# Altium footprint library Supernova.PcbLib: 77 footprints (part 1 of 6)
Each footprint in its own frame and in the unit in brackets; x right, y up, seen from the top. Pads: shape width x height; smd on the part's side, far side on the other; paste and mask are expansions set on the pad; w line width, h text height; cw(c..) or ccw(c..) is an arc to the next point about the centre after c.
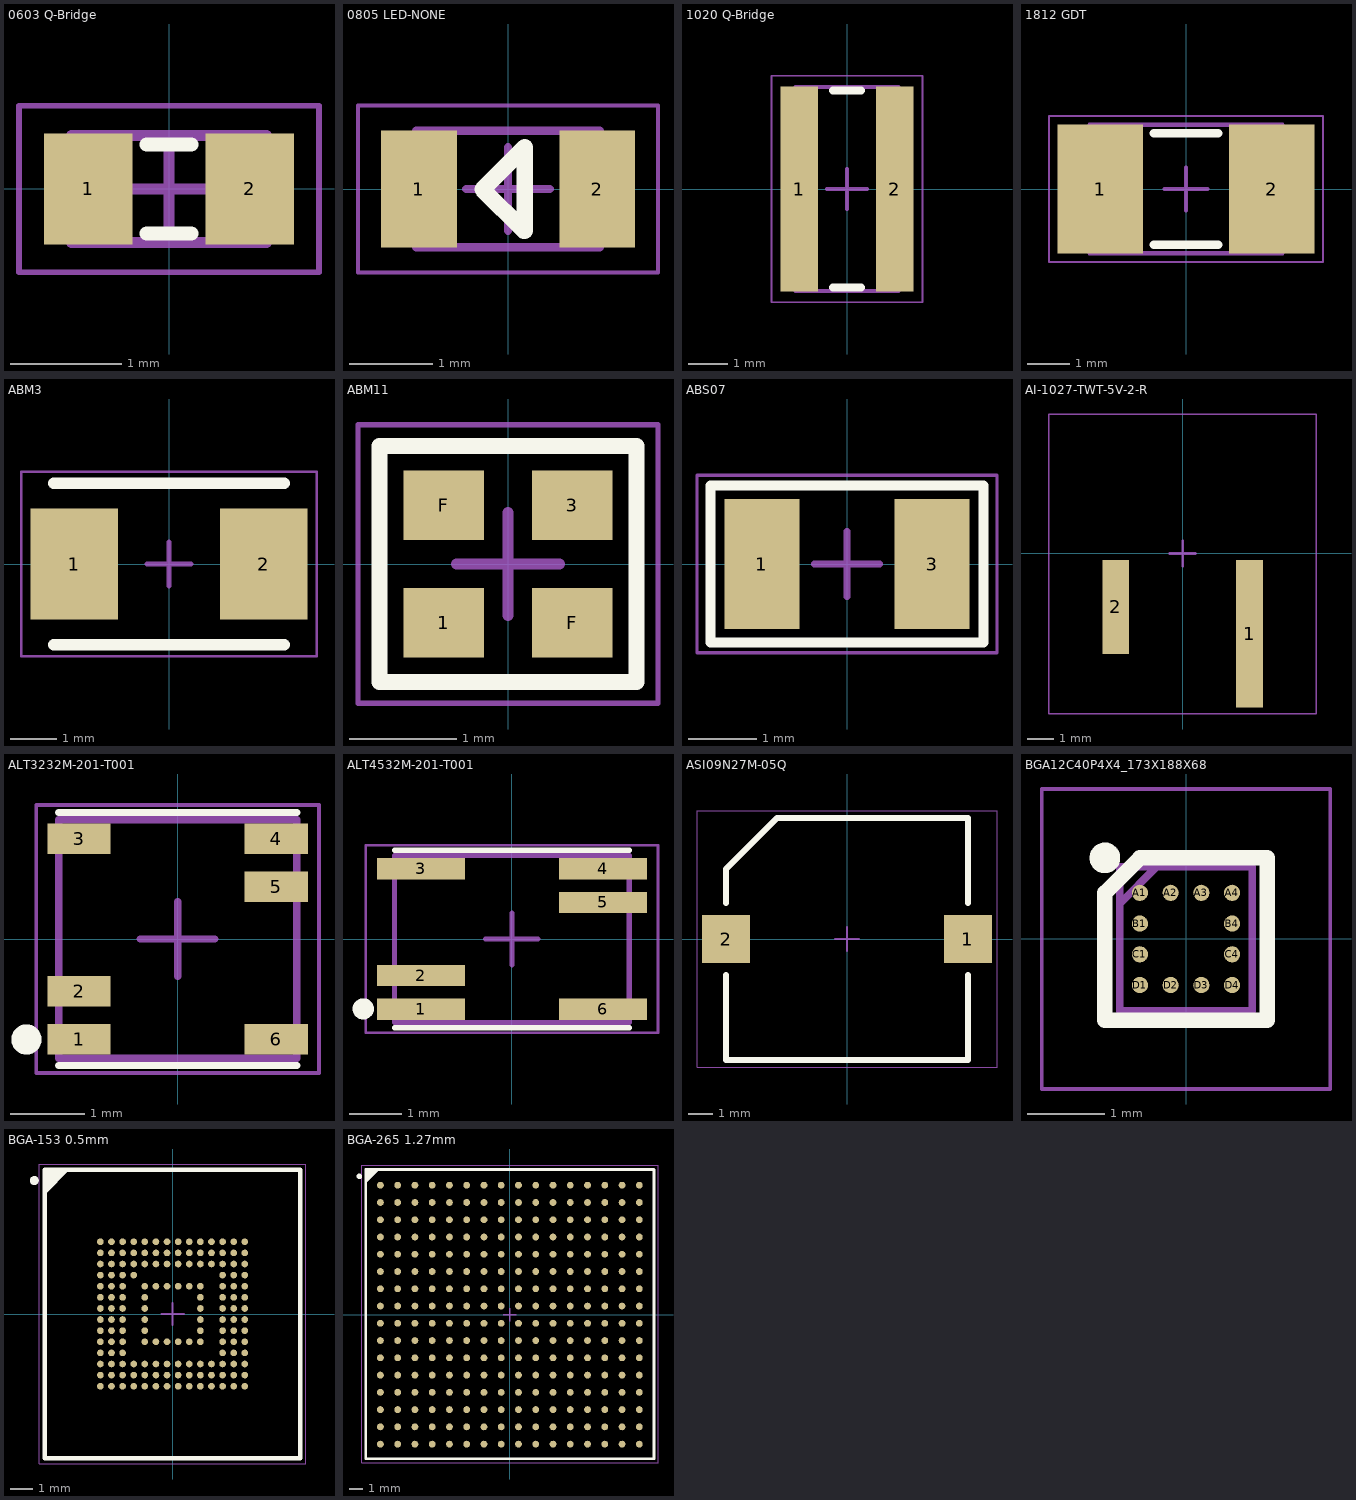
[diagram p0: the footprints below, top view; thin cyan lines are the x and y axes]

## 0603 Q-Bridge [mm] "Chip Capacitor, 2-Leads, Body 1.60x0.81mm, IPC Medium Density"
height 0.9
pads (2):
  rect 0.798x1 smd mask+0.051: 1(-0.726,0) 2(0.726,0)
Top Overlay:
  lines w0.127: -0.2,-0.4 0.2,-0.4 ; -0.2,0.4 0.2,0.4
Top 3D Body:
  lines w0.1: -0.875,-0.48 0.875,-0.48 0.875,0.48 -0.875,0.48 -0.875,-0.48
Top Courtyard:
  lines w0.05: -1.35,-0.75 1.35,-0.75 1.35,0.75 -1.35,0.75 -1.35,-0.75
  lines w0.1: -0.48,0 0.48,0 ; 0,-0.48 0,0.48
3D body: height 0.9, standoff 0, extent 0.525,-0.48 0.875,0.48
3D body: height 0.9, standoff 0, extent -0.875,-0.48 -0.525,0.48
3D body: height 0.9, standoff 0, extent -0.525,-0.48 0.525,0.48

## 0805 LED-NONE [mm] "Chip LED, 2-Leads, Body 2.05x1.25mm, IPC Medium Density"
height 0.8
pads (2):
  rect 0.91x1.41 smd: 1(-1.07,0) 2(1.07,0)
Top Overlay:
  lines w0.2: 0.192,-0.5 -0.304,-0.004 0.2,0.5 0.2,-0.5
Top 3D Body:
  lines w0.1: -1.1,-0.7 -1.1,0.7 1.1,0.7 1.1,-0.7 -1.1,-0.7
Top Courtyard:
  lines w0.05: -1.8,-1 -1.8,1 1.8,1 1.8,-1 -1.8,-1
  lines w0.1: -0.5,0 0.5,0 ; 0,-0.5 0,0.5
3D body: height 0.3, standoff 0, extent -0.75,-0.7 0.75,0.7
3D body: height 0.8, standoff 0.3, extent -0.75,-0.7 0.75,0.7
3D body: height 0.3, standoff 0, extent -1.1,-0.7 -0.75,0.7
3D body: height 0.3, standoff 0, extent 0.75,-0.7 1.1,0.7

## 1020 Q-Bridge [mm] "Chip Resistor, 2-Leads, Body 2.54x5.08mm, IPC Medium Density"
height 1.07
pads (2):
  rect 0.95x5.15 smd: 1(-1.2,0) 2(1.2,0)
Top Overlay:
  lines w0.2: -0.35,-2.475 0.35,-2.475 ; -0.35,2.475 0.35,2.475
Top 3D Body:
  lines w0.1: -1.295,-2.565 1.295,-2.565 1.295,2.565 -1.295,2.565 -1.295,-2.565
Top Courtyard:
  lines w0.05: -1.9,-2.85 1.9,-2.85 1.9,2.85 -1.9,2.85 -1.9,-2.85
  lines w0.1: -0.5,0 0.5,0 ; 0,-0.5 0,0.5
3D body: height 1.07, standoff 0, extent 0.785,-2.565 1.295,2.565
3D body: height 1.07, standoff 0, extent -1.295,-2.565 -0.785,2.565
3D body: height 1.07, standoff 0, extent -0.785,-2.565 0.785,2.565

## 1812 GDT [mm] "Chip Resistor, 2-Leads, Body 6.10x2.54mm, IPC Medium Density"
height 2.79
pads (2):
  rect 2x3 smd paste-0.25: 1(-2,0) 2(2,0)
Top Overlay:
  lines w0.2: -0.75,-1.3 0.75,-1.3 ; -0.75,1.3 0.75,1.3
Top 3D Body:
  lines w0.1: -2.25,-1.5 2.25,-1.5 2.25,1.5 -2.25,1.5 -2.25,-1.5
Top Courtyard:
  lines w0.05: -3.2,-1.7 3.2,-1.7 3.2,1.7 -3.2,1.7 -3.2,-1.7
  lines w0.1: -0.5,0 0.5,0 ; 0,-0.5 0,0.5
3D body: height 2.79, standoff 0, extent 1.25,-1.525 2.25,1.5
3D body: height 2.79, standoff 0, extent -2.25,-1.5 -1.25,1.5
3D body: height 2.99, standoff 0, extent -1.25,-1.497 1.25,1.497

## ABM3 [mm]
pads (2):
  rect 1.9x2.4 smd paste-0.2: 1(-2.05,0) 2(2.05,0)
Top Overlay:
  lines w0.254: -2.5,-1.75 2.5,-1.75 ; -2.5,1.75 2.5,1.75
Top Courtyard:
  lines w0.05: -3.2,-2 -3.2,2 3.2,2 3.2,-2 -3.2,-2
  lines w0.1: -0.48,0 0.48,0 ; 0,-0.48 0,0.48
3D body: height 1.3, standoff 0, extent -2.5,-1.6 2.5,1.6

## ABM11 [mm]
height 0.6
pads (4):
  rect 0.75x0.65 smd: 1(-0.6,-0.55) 3(0.6,0.55) F(-0.6,0.55) F(0.6,-0.55)
Top Overlay:
  lines w0.15: -1.2,-1.1 -1.2,1.1 1.2,1.1 1.2,-1.1 -1.2,-1.1
Top Courtyard:
  lines w0.05: -1.4,-1.3 1.4,-1.3 1.4,1.3 -1.4,1.3 -1.4,-1.3
  lines w0.1: -0.48,0 0.48,0 ; 0,-0.48 0,0.48
3D body: height 0.55, standoff 0.5, extent -1,-0.8 1,0.8
3D body: height 0.5, standoff 0, extent -1,-0.8 1,0.8
3D body: height 0.59, standoff 0.55, extent -0.9,-0.7 0.9,0.7

## ABS07 [mm]
height 0.6
pads (2):
  rect 1.1x1.9 smd: 1(-1.25,0) 3(1.25,0)
Top Overlay:
  lines w0.15: -2,-1.15 -2,1.15 2,1.15 2,-1.15 -2,-1.15
Top Courtyard:
  lines w0.05: -2.2,-1.3 -2.2,1.3 2.2,1.3 2.2,-1.3 -2.2,-1.3
  lines w0.1: -0.48,0 0.48,0 ; 0,-0.48 0,0.48
3D body: height 0.8, standoff 0, extent -1.6,-0.75 1.6,0.75
3D body: height 0.9, standoff 0.8, extent -1.55,-0.7 1.55,0.7

## AI-1027-TWT-5V-2-R [mm]
pads (2):
  rect 1x5.5 smd paste-2: 1(2.5,-3)
  rect 1x3.5 smd paste-2: 2(-2.5,-2)
Top Courtyard:
  lines w0.05: -5,-6 -5,5.211 5,5.211 5,-6 -5,-6
  lines w0.1: -0.48,0 0.48,0 ; 0,-0.48 0,0.48
3D body: height 0.6, standoff 0, extent 2.202,-5.5 2.8,0
3D body: height 0.6, standoff 0, extent -2.799,-3.5 -2.201,0
3D body: height 5.1, standoff -4.5, extent -4.8,0 4.8,5

## ALT3232M-201-T001 [mm]
height 2.9
pads (6):
  rect 0.85x0.41 smd mask+0.025: 1(-1.325,-1.35) 2(-1.325,-0.7) 3(-1.325,1.35) 4(1.325,1.35) 5(1.325,0.7) 6(1.325,-1.35)
Top Overlay:
  circle w0.203: c-2.03,-1.35 r0.102
  lines w0.1: -1.6,-1.7 1.6,-1.7 ; -1.6,1.7 1.6,1.7
Top 3D Body:
  lines w0.1: -1.6,-1.6 -1.6,1.6 1.6,1.6 1.6,-1.6 -1.6,-1.6
Top Courtyard:
  lines w0.05: -1.9,-1.8 -1.9,1.8 1.9,1.8 1.9,-1.8 -1.9,-1.8
  lines w0.1: -0.5,0 0.5,0 ; 0,-0.5 0,0.5
3D body: height 2.9, standoff 0, extent -1.6,-1.6 1.6,1.6

## ALT4532M-201-T001 [mm]
height 2.9
pads (6):
  rect 1.69x0.41 smd mask+0.025: 1(-1.745,-1.35) 2(-1.745,-0.7) 3(-1.745,1.35) 4(1.745,1.35) 5(1.745,0.7) 6(1.745,-1.35)
Top Overlay:
  circle w0.203: c-2.848,-1.339 r0.102
  lines w0.1: -2.25,-1.7 2.25,-1.7 ; -2.25,1.7 2.25,1.7
Top 3D Body:
  lines w0.1: -2.25,-1.6 2.25,-1.6 2.25,1.6 -2.25,1.6 -2.25,-1.6
Top Courtyard:
  lines w0.05: -2.8,-1.8 2.8,-1.8 2.8,1.8 -2.8,1.8 -2.8,-1.8
  lines w0.1: -0.5,0 0.5,0 ; 0,-0.5 0,0.5
3D body: height 2.9, standoff 0, extent -2.25,-1.6 2.25,1.6

## ASI09N27M-05Q [mm]
height 5
pads (2):
  rect 2x2 smd paste-0.15: 1(5,0) 2(-5,0)
Top Overlay:
  lines w0.254: -5,-1.5 -5,-5 5,-5 5,-1.5 ; -5,1.5 -5,2.9 -2.9,5 5,5 5,1.5
Top Courtyard:
  lines w0.05: -6.2,-5.3 -6.2,5.3 6.2,5.3 6.2,-5.3 -6.2,-5.3
  lines w0.1: -0.48,0 0.48,0 ; 0,-0.48 0,0.48
3D body: height 2, standoff 0, extent -5,-0.8 -4,0.8
3D body: height 2, standoff 0, extent 4,-0.8 5,0.8
3D body: height 5, standoff 0, extent -4.8,-4.8 4.8,4.8

## BGA12C40P4X4_173X188X68 [mm]
pads (12):
  round 0.212 smd: A1(-0.6,0.6) A2(-0.2,0.6) A3(0.2,0.6) A4(0.6,0.6) B1(-0.6,0.2) B4(0.6,0.2) C1(-0.6,-0.2) C4(0.6,-0.2) D1(-0.6,-0.6) D2(-0.2,-0.6) D3(0.2,-0.6) D4(0.6,-0.6)
Top Overlay:
  circle w0.2: c-1.056,1.056 r0.1
  lines w0.2: -1.056,-1.056 1.056,-1.056 1.056,1.056 -0.6,1.056 -1.056,0.6 -1.056,-1.056
Top 3D Body:
  lines w0.1: -0.863,0.461 -0.387,0.937 ; -0.863,-0.937 0.863,-0.937 0.863,0.938 -0.863,0.938 -0.863,-0.937
Top Courtyard:
  lines w0.05: -1.878,-1.953 1.878,-1.953 1.878,1.952 -1.878,1.952 -1.878,-1.953
3D body "LMG1205YFXR.stp": height 0.67, standoff 0, extent -0.863,-0.937 0.863,0.937

## BGA-153 0.5mm [mm] "BGA, 153-Leads, Body 11.50x13.00mmx1.00mm, Pitch 0.50mm"
height 1
pads (153):
  round 0.3 smd paste-0.025 mask+0.025: A1(-3.25,3.25) A2(-2.75,3.25) A3(-2.25,3.25) A4(-1.75,3.25) A5(-1.25,3.25) A6(-0.75,3.25) A7(-0.25,3.25) A8(0.25,3.25) A9(0.75,3.25) A10(1.25,3.25) A11(1.75,3.25) A12(2.25,3.25) A13(2.75,3.25) A14(3.25,3.25) B1(-3.25,2.75) B2(-2.75,2.75) B3(-2.25,2.75) B4(-1.75,2.75) B5(-1.25,2.75) B6(-0.75,2.75) B7(-0.25,2.75) B8(0.25,2.75) B9(0.75,2.75) B10(1.25,2.75) B11(1.75,2.75) B12(2.25,2.75) B13(2.75,2.75) B14(3.25,2.75) C1(-3.25,2.25) C2(-2.75,2.25) C3(-2.25,2.25) C4(-1.75,2.25) C5(-1.25,2.25) C6(-0.75,2.25) C7(-0.25,2.25) C8(0.25,2.25) C9(0.75,2.25) C10(1.25,2.25) C11(1.75,2.25) C12(2.25,2.25) C13(2.75,2.25) C14(3.25,2.25) D1(-3.25,1.75) D2(-2.75,1.75) D3(-2.25,1.75) D4(-1.75,1.75) D12(2.25,1.75) D13(2.75,1.75) D14(3.25,1.75) E1(-3.25,1.25) E2(-2.75,1.25) E3(-2.25,1.25) E5(-1.25,1.25) E6(-0.75,1.25) E7(-0.25,1.25) E8(0.25,1.25) E9(0.75,1.25) E10(1.25,1.25) E12(2.25,1.25) E13(2.75,1.25) E14(3.25,1.25) F1(-3.25,0.75) F2(-2.75,0.75) F3(-2.25,0.75) F5(-1.25,0.75) F10(1.25,0.75) F12(2.25,0.75) F13(2.75,0.75) F14(3.25,0.75) G1(-3.25,0.25) G2(-2.75,0.25) G3(-2.25,0.25) G5(-1.25,0.25) G10(1.25,0.25) G12(2.25,0.25) G13(2.75,0.25) G14(3.25,0.25) H1(-3.25,-0.25) H2(-2.75,-0.25) H3(-2.25,-0.25) H5(-1.25,-0.25) H10(1.25,-0.25) H12(2.25,-0.25) H13(2.75,-0.25) H14(3.25,-0.25) J1(-3.25,-0.75) J2(-2.75,-0.75) J3(-2.25,-0.75) J5(-1.25,-0.75) J10(1.25,-0.75) J12(2.25,-0.75) J13(2.75,-0.75) J14(3.25,-0.75) K1(-3.25,-1.25) K2(-2.75,-1.25) K3(-2.25,-1.25) K5(-1.25,-1.25) K6(-0.75,-1.25) K7(-0.25,-1.25) K8(0.25,-1.25) K9(0.75,-1.25) K10(1.25,-1.25) K12(2.25,-1.25) K13(2.75,-1.25) K14(3.25,-1.25) L1(-3.25,-1.75) L2(-2.75,-1.75) L3(-2.25,-1.75) L12(2.25,-1.75) L13(2.75,-1.75) L14(3.25,-1.75) M1(-3.25,-2.25) M2(-2.75,-2.25) M3(-2.25,-2.25) M4(-1.75,-2.25) M5(-1.25,-2.25) M6(-0.75,-2.25) M7(-0.25,-2.25) M8(0.25,-2.25) M9(0.75,-2.25) M10(1.25,-2.25) M11(1.75,-2.25) M12(2.25,-2.25) M13(2.75,-2.25) M14(3.25,-2.25) N1(-3.25,-2.75) N2(-2.75,-2.75) N3(-2.25,-2.75) N4(-1.75,-2.75) N5(-1.25,-2.75) N6(-0.75,-2.75) N7(-0.25,-2.75) N8(0.25,-2.75) N9(0.75,-2.75) N10(1.25,-2.75) N11(1.75,-2.75) N12(2.25,-2.75) N13(2.75,-2.75) N14(3.25,-2.75) P1(-3.25,-3.25) P2(-2.75,-3.25) P3(-2.25,-3.25) P4(-1.75,-3.25) P5(-1.25,-3.25) P6(-0.75,-3.25) P7(-0.25,-3.25) P8(0.25,-3.25) P9(0.75,-3.25) P10(1.25,-3.25) P11(1.75,-3.25) P12(2.25,-3.25) P13(2.75,-3.25) P14(3.25,-3.25)
Top Overlay:
  circle w0.203: c-6.221,6.004 r0.102
  region: -4.75,6.5 -5.75,5.5 -5.75,6.5
  lines w0.2: -5.75,5.5 -4.75,6.5 ; -5.75,-6.5 5.75,-6.5 5.75,6.5 -5.75,6.5 -5.75,-6.5
Top 3D Body:
  lines w0.1: -5.75,-6.5 5.75,-6.5 5.75,6.5 -5.75,6.5 -5.75,-6.5
Top Courtyard:
  lines w0.05: -6,-6.75 6,-6.75 6,6.75 -6,6.75 -6,-6.75
  lines w0.1: -0.5,0 0.5,0 ; 0,-0.5 0,0.5
3D body: height 1, standoff 0.15, extent -5.75,-6.5 5.75,6.5

## BGA-265 1.27mm [mm] "BGA_16x16_1p27mm"
height 2
pads (256):
  round 0.5 smd paste-0.04 mask+0.05: A1(-9.525,9.525) A2(-8.255,9.525) A3(-6.985,9.525) A4(-5.715,9.525) A5(-4.445,9.525) A6(-3.175,9.525) A7(-1.905,9.525) A8(-0.635,9.525) A9(0.635,9.525) A10(1.905,9.525) A11(3.175,9.525) A12(4.445,9.525) A13(5.715,9.525) A14(6.985,9.525) A15(8.255,9.525) A16(9.525,9.525) B1(-9.525,8.255) B2(-8.255,8.255) B3(-6.985,8.255) B4(-5.715,8.255) B5(-4.445,8.255) B6(-3.175,8.255) B7(-1.905,8.255) B8(-0.635,8.255) B9(0.635,8.255) B10(1.905,8.255) B11(3.175,8.255) B12(4.445,8.255) B13(5.715,8.255) B14(6.985,8.255) B15(8.255,8.255) B16(9.525,8.255) C1(-9.525,6.985) C2(-8.255,6.985) C3(-6.985,6.985) C4(-5.715,6.985) C5(-4.445,6.985) C6(-3.175,6.985) C7(-1.905,6.985) C8(-0.635,6.985) C9(0.635,6.985) C10(1.905,6.985) C11(3.175,6.985) C12(4.445,6.985) C13(5.715,6.985) C14(6.985,6.985) C15(8.255,6.985) C16(9.525,6.985) D1(-9.525,5.715) D2(-8.255,5.715) D3(-6.985,5.715) D4(-5.715,5.715) D5(-4.445,5.715) D6(-3.175,5.715) D7(-1.905,5.715) D8(-0.635,5.715) D9(0.635,5.715) D10(1.905,5.715) D11(3.175,5.715) D12(4.445,5.715) D13(5.715,5.715) D14(6.985,5.715) D15(8.255,5.715) D16(9.525,5.715) E1(-9.525,4.445) E2(-8.255,4.445) E3(-6.985,4.445) E4(-5.715,4.445) E5(-4.445,4.445) E6(-3.175,4.445) E7(-1.905,4.445) E8(-0.635,4.445) E9(0.635,4.445) E10(1.905,4.445) E11(3.175,4.445) E12(4.445,4.445) E13(5.715,4.445) E14(6.985,4.445) E15(8.255,4.445) E16(9.525,4.445) F1(-9.525,3.175) F2(-8.255,3.175) F3(-6.985,3.175) F4(-5.715,3.175) F5(-4.445,3.175) F6(-3.175,3.175) F7(-1.905,3.175) F8(-0.635,3.175) F9(0.635,3.175) F10(1.905,3.175) F11(3.175,3.175) F12(4.445,3.175) F13(5.715,3.175) F14(6.985,3.175) F15(8.255,3.175) F16(9.525,3.175) G1(-9.525,1.905) G2(-8.255,1.905) G3(-6.985,1.905) G4(-5.715,1.905) G5(-4.445,1.905) G6(-3.175,1.905) G7(-1.905,1.905) G8(-0.635,1.905) G9(0.635,1.905) G10(1.905,1.905) G11(3.175,1.905) G12(4.445,1.905) G13(5.715,1.905) G14(6.985,1.905) G15(8.255,1.905) G16(9.525,1.905) H1(-9.525,0.635) H2(-8.255,0.635) H3(-6.985,0.635) H4(-5.715,0.635) H5(-4.445,0.635) H6(-3.175,0.635) H7(-1.905,0.635) H8(-0.635,0.635) H9(0.635,0.635) H10(1.905,0.635) H11(3.175,0.635) H12(4.445,0.635) H13(5.715,0.635) H14(6.985,0.635) H15(8.255,0.635) H16(9.525,0.635) J1(-9.525,-0.635) J2(-8.255,-0.635) J3(-6.985,-0.635) J4(-5.715,-0.635) J5(-4.445,-0.635) J6(-3.175,-0.635) J7(-1.905,-0.635) J8(-0.635,-0.635) J9(0.635,-0.635) J10(1.905,-0.635) J11(3.175,-0.635) J12(4.445,-0.635) J13(5.715,-0.635) J14(6.985,-0.635) J15(8.255,-0.635) J16(9.525,-0.635) K1(-9.525,-1.905) K2(-8.255,-1.905) K3(-6.985,-1.905) K4(-5.715,-1.905) K5(-4.445,-1.905) K6(-3.175,-1.905) K7(-1.905,-1.905) K8(-0.635,-1.905) K9(0.635,-1.905) K10(1.905,-1.905) K11(3.175,-1.905) K12(4.445,-1.905) K13(5.715,-1.905) K14(6.985,-1.905) K15(8.255,-1.905) K16(9.525,-1.905) L1(-9.525,-3.175) L2(-8.255,-3.175) L3(-6.985,-3.175) L4(-5.715,-3.175) L5(-4.445,-3.175) L6(-3.175,-3.175) L7(-1.905,-3.175) L8(-0.635,-3.175) L9(0.635,-3.175) L10(1.905,-3.175) L11(3.175,-3.175) L12(4.445,-3.175) L13(5.715,-3.175) L14(6.985,-3.175) L15(8.255,-3.175) L16(9.525,-3.175) M1(-9.525,-4.445) M2(-8.255,-4.445) M3(-6.985,-4.445) M4(-5.715,-4.445) M5(-4.445,-4.445) M6(-3.175,-4.445) M7(-1.905,-4.445) M8(-0.635,-4.445) M9(0.635,-4.445) M10(1.905,-4.445) M11(3.175,-4.445) M12(4.445,-4.445) M13(5.715,-4.445) M14(6.985,-4.445) M15(8.255,-4.445) M16(9.525,-4.445) N1(-9.525,-5.715) N2(-8.255,-5.715) N3(-6.985,-5.715) N4(-5.715,-5.715) N5(-4.445,-5.715) N6(-3.175,-5.715) N7(-1.905,-5.715) N8(-0.635,-5.715) N9(0.635,-5.715) N10(1.905,-5.715) N11(3.175,-5.715) N12(4.445,-5.715) N13(5.715,-5.715) N14(6.985,-5.715) N15(8.255,-5.715) N16(9.525,-5.715) P1(-9.525,-6.985) P2(-8.255,-6.985) P3(-6.985,-6.985) P4(-5.715,-6.985) P5(-4.445,-6.985) P6(-3.175,-6.985) P7(-1.905,-6.985) P8(-0.635,-6.985) P9(0.635,-6.985) P10(1.905,-6.985) P11(3.175,-6.985) P12(4.445,-6.985) P13(5.715,-6.985) P14(6.985,-6.985) P15(8.255,-6.985) P16(9.525,-6.985) R1(-9.525,-8.255) R2(-8.255,-8.255) R3(-6.985,-8.255) R4(-5.715,-8.255) R5(-4.445,-8.255) R6(-3.175,-8.255) R7(-1.905,-8.255) R8(-0.635,-8.255) R9(0.635,-8.255) R10(1.905,-8.255) R11(3.175,-8.255) R12(4.445,-8.255) R13(5.715,-8.255) R14(6.985,-8.255) R15(8.255,-8.255) R16(9.525,-8.255) T1(-9.525,-9.525) T2(-8.255,-9.525) T3(-6.985,-9.525) T4(-5.715,-9.525) T5(-4.445,-9.525) T6(-3.175,-9.525) T7(-1.905,-9.525) T8(-0.635,-9.525) T9(0.635,-9.525) T10(1.905,-9.525) T11(3.175,-9.525) T12(4.445,-9.525) T13(5.715,-9.525) T14(6.985,-9.525) T15(8.255,-9.525) T16(9.525,-9.525)
Top Overlay:
  circle w0.203: c-11.071,10.179 r0.102
  region: -9.6,10.675 -10.6,9.675 -10.6,10.675
  lines w0.2: -10.6,-10.6 -10.6,10.675 10.6,10.675 10.6,-10.6 -10.6,-10.6
Top Courtyard:
  lines w0.05: -10.9,-10.9 -10.9,11 10.9,11 10.9,-10.9 -10.9,-10.9
  lines w0.1: -0.48,0 0.48,0 ; 0,-0.48 0,0.48
3D body: height 0.75, standoff 0, extent -9.899,-9.897 -9.15,-9.152
3D body: height 0.75, standoff 0, extent -9.899,-7.357 -9.15,-6.612
3D body: height 0.75, standoff 0, extent -9.899,-6.087 -9.15,-5.342
3D body: height 0.75, standoff 0, extent -9.899,-4.817 -9.15,-4.072
3D body: height 0.75, standoff 0, extent -9.899,-3.547 -9.15,-2.802
3D body: height 0.75, standoff 0, extent -9.899,-1.007 -9.15,-0.262
3D body: height 0.75, standoff 0, extent -9.899,0.263 -9.15,1.008
3D body: height 0.75, standoff 0, extent -9.899,2.803 -9.15,3.548
3D body: height 0.75, standoff 0, extent -9.899,4.073 -9.15,4.818
3D body: height 0.75, standoff 0, extent -9.899,5.343 -9.15,6.088
3D body: height 0.75, standoff 0, extent -9.899,6.613 -9.15,7.358
3D body: height 0.75, standoff 0, extent -9.899,9.153 -9.15,9.898
3D body: height 0.75, standoff 0, extent -7.359,-9.897 -6.61,-9.152
3D body: height 0.75, standoff 0, extent -7.359,-7.357 -6.61,-6.612
3D body: height 0.75, standoff 0, extent -7.359,-6.087 -6.61,-5.342
3D body: height 0.75, standoff 0, extent -7.359,-4.817 -6.61,-4.072
3D body: height 0.75, standoff 0, extent -7.359,-3.547 -6.61,-2.802
3D body: height 0.75, standoff 0, extent -7.359,-1.007 -6.61,-0.262
3D body: height 0.75, standoff 0, extent -7.359,0.263 -6.61,1.008
3D body: height 0.75, standoff 0, extent -7.359,2.803 -6.61,3.548
3D body: height 0.75, standoff 0, extent -7.359,4.073 -6.61,4.818
3D body: height 0.75, standoff 0, extent -7.359,5.343 -6.61,6.088
3D body: height 0.75, standoff 0, extent -7.359,6.613 -6.61,7.358
3D body: height 0.75, standoff 0, extent -7.359,9.153 -6.61,9.898
3D body: height 0.75, standoff 0, extent -6.089,-9.897 -5.34,-9.152
3D body: height 0.75, standoff 0, extent -4.819,-9.897 -4.07,-9.152
3D body: height 0.75, standoff 0, extent -6.089,-7.357 -5.34,-6.612
3D body: height 0.75, standoff 0, extent -4.819,-7.357 -4.07,-6.612
3D body: height 0.75, standoff 0, extent -6.089,-6.087 -5.34,-5.342
3D body: height 0.75, standoff 0, extent -4.819,-6.087 -4.07,-5.342
3D body: height 0.75, standoff 0, extent -6.089,-4.817 -5.34,-4.072
3D body: height 0.75, standoff 0, extent -4.819,-4.817 -4.07,-4.072
3D body: height 0.75, standoff 0, extent -6.089,-3.547 -5.34,-2.802
3D body: height 0.75, standoff 0, extent -4.819,-3.547 -4.07,-2.802
3D body: height 0.75, standoff 0, extent -6.089,-1.007 -5.34,-0.262
3D body: height 0.75, standoff 0, extent -4.819,-1.007 -4.07,-0.262
3D body: height 0.75, standoff 0, extent -6.089,0.263 -5.34,1.008
3D body: height 0.75, standoff 0, extent -4.819,0.263 -4.07,1.008
3D body: height 0.75, standoff 0, extent -6.089,2.803 -5.34,3.548
3D body: height 0.75, standoff 0, extent -4.819,2.803 -4.07,3.548
3D body: height 0.75, standoff 0, extent -6.089,4.073 -5.34,4.818
3D body: height 0.75, standoff 0, extent -4.819,4.073 -4.07,4.818
3D body: height 0.75, standoff 0, extent -6.089,5.343 -5.34,6.088
3D body: height 0.75, standoff 0, extent -4.819,5.343 -4.07,6.088
3D body: height 0.75, standoff 0, extent -6.089,6.613 -5.34,7.358
3D body: height 0.75, standoff 0, extent -4.819,6.613 -4.07,7.358
3D body: height 0.75, standoff 0, extent -4.819,9.153 -4.07,9.898
3D body: height 0.75, standoff 0, extent -6.089,9.153 -5.34,9.898
3D body: height 0.75, standoff 0, extent -3.549,-9.897 -2.8,-9.152
3D body: height 0.75, standoff 0, extent -3.549,-7.357 -2.8,-6.612
3D body: height 0.75, standoff 0, extent -3.549,-6.087 -2.8,-5.342
3D body: height 0.75, standoff 0, extent -3.549,-4.817 -2.8,-4.072
3D body: height 0.75, standoff 0, extent -3.549,-3.547 -2.8,-2.802
3D body: height 0.75, standoff 0, extent -3.549,-1.007 -2.8,-0.262
3D body: height 0.75, standoff 0, extent -3.549,0.263 -2.8,1.008
3D body: height 0.75, standoff 0, extent -3.549,2.803 -2.8,3.548
3D body: height 0.75, standoff 0, extent -3.549,4.073 -2.8,4.818
3D body: height 0.75, standoff 0, extent -3.549,5.343 -2.8,6.088
3D body: height 0.75, standoff 0, extent -3.549,6.613 -2.8,7.358
3D body: height 0.75, standoff 0, extent -3.549,9.153 -2.8,9.898
3D body: height 0.75, standoff 0, extent -1.009,-9.897 -0.26,-9.152
3D body: height 0.75, standoff 0, extent -1.009,-7.357 -0.26,-6.612
3D body: height 0.75, standoff 0, extent -1.009,-6.087 -0.26,-5.342
3D body: height 0.75, standoff 0, extent -1.009,-4.817 -0.26,-4.072
3D body: height 0.75, standoff 0, extent -1.009,-3.547 -0.26,-2.802
3D body: height 0.75, standoff 0, extent -1.009,-1.007 -0.26,-0.262
3D body: height 0.75, standoff 0, extent -1.009,0.263 -0.26,1.008
3D body: height 0.75, standoff 0, extent -1.009,2.803 -0.26,3.548
3D body: height 0.75, standoff 0, extent -1.009,4.073 -0.26,4.818
3D body: height 0.75, standoff 0, extent -1.009,5.343 -0.26,6.088
3D body: height 0.75, standoff 0, extent -1.009,6.613 -0.26,7.358
3D body: height 0.75, standoff 0, extent -1.009,9.153 -0.26,9.898
3D body: height 0.75, standoff 0, extent 0.261,-9.897 1.01,-9.152
3D body: height 0.75, standoff 0, extent 0.261,-7.357 1.01,-6.612
3D body: height 0.75, standoff 0, extent 0.261,-6.087 1.01,-5.342
3D body: height 0.75, standoff 0, extent 0.261,-4.817 1.01,-4.072
3D body: height 0.75, standoff 0, extent 0.261,-3.547 1.01,-2.802
3D body: height 0.75, standoff 0, extent 0.261,-1.007 1.01,-0.262
3D body: height 0.75, standoff 0, extent 0.261,0.263 1.01,1.008
3D body: height 0.75, standoff 0, extent 0.261,2.803 1.01,3.548
3D body: height 0.75, standoff 0, extent 0.261,4.073 1.01,4.818
3D body: height 0.75, standoff 0, extent 0.261,5.343 1.01,6.088
3D body: height 0.75, standoff 0, extent 0.261,6.613 1.01,7.358
3D body: height 0.75, standoff 0, extent 0.261,9.153 1.01,9.898
3D body: height 0.75, standoff 0, extent 2.801,-9.897 3.55,-9.152
3D body: height 0.75, standoff 0, extent 2.801,-7.357 3.55,-6.612
3D body: height 0.75, standoff 0, extent 2.801,-6.087 3.55,-5.342
3D body: height 0.75, standoff 0, extent 2.801,-4.817 3.55,-4.072
3D body: height 0.75, standoff 0, extent 2.801,-3.547 3.55,-2.802
3D body: height 0.75, standoff 0, extent 2.801,-1.007 3.55,-0.262
3D body: height 0.75, standoff 0, extent 2.801,0.263 3.55,1.008
3D body: height 0.75, standoff 0, extent 2.801,2.803 3.55,3.548
3D body: height 0.75, standoff 0, extent 2.801,4.073 3.55,4.818
3D body: height 0.75, standoff 0, extent 2.801,5.343 3.55,6.088
3D body: height 0.75, standoff 0, extent 2.801,6.613 3.55,7.358
3D body: height 0.75, standoff 0, extent 2.801,9.153 3.55,9.898
3D body: height 0.75, standoff 0, extent 4.071,-9.897 4.82,-9.152
3D body: height 0.75, standoff 0, extent 5.341,-9.897 6.09,-9.152
3D body: height 0.75, standoff 0, extent 4.071,-7.357 4.82,-6.612
3D body: height 0.75, standoff 0, extent 5.341,-7.357 6.09,-6.612
3D body: height 0.75, standoff 0, extent 4.071,-6.087 4.82,-5.342
3D body: height 0.75, standoff 0, extent 5.341,-6.087 6.09,-5.342
3D body: height 0.75, standoff 0, extent 4.071,-4.817 4.82,-4.072
3D body: height 0.75, standoff 0, extent 5.341,-4.817 6.09,-4.072
3D body: height 0.75, standoff 0, extent 4.071,-3.547 4.82,-2.802
3D body: height 0.75, standoff 0, extent 5.341,-3.547 6.09,-2.802
3D body: height 0.75, standoff 0, extent 4.071,-1.007 4.82,-0.262
3D body: height 0.75, standoff 0, extent 5.341,-1.007 6.09,-0.262
3D body: height 0.75, standoff 0, extent 4.071,0.263 4.82,1.008
3D body: height 0.75, standoff 0, extent 5.341,0.263 6.09,1.008
3D body: height 0.75, standoff 0, extent 4.071,2.803 4.82,3.548
3D body: height 0.75, standoff 0, extent 5.341,2.803 6.09,3.548
3D body: height 0.75, standoff 0, extent 4.071,4.073 4.82,4.818
3D body: height 0.75, standoff 0, extent 5.341,4.073 6.09,4.818
3D body: height 0.75, standoff 0, extent 4.071,5.343 4.82,6.088
3D body: height 0.75, standoff 0, extent 5.341,5.343 6.09,6.088
3D body: height 0.75, standoff 0, extent 4.071,6.613 4.82,7.358
3D body: height 0.75, standoff 0, extent 5.341,6.613 6.09,7.358
3D body: height 0.75, standoff 0, extent 5.341,9.153 6.09,9.898
3D body: height 0.75, standoff 0, extent 4.071,9.153 4.82,9.898
3D body: height 0.75, standoff 0, extent 6.611,-9.897 7.36,-9.152
3D body: height 0.75, standoff 0, extent 6.611,-7.357 7.36,-6.612
3D body: height 0.75, standoff 0, extent 6.611,-6.087 7.36,-5.342
3D body: height 0.75, standoff 0, extent 6.611,-4.817 7.36,-4.072
3D body: height 0.75, standoff 0, extent 6.611,-3.547 7.36,-2.802
3D body: height 0.75, standoff 0, extent 6.611,-1.007 7.36,-0.262
3D body: height 0.75, standoff 0, extent 6.611,0.263 7.36,1.008
3D body: height 0.75, standoff 0, extent 6.611,2.803 7.36,3.548
3D body: height 0.75, standoff 0, extent 6.611,4.073 7.36,4.818
3D body: height 0.75, standoff 0, extent 6.611,5.343 7.36,6.088
3D body: height 0.75, standoff 0, extent 6.611,6.613 7.36,7.358
3D body: height 0.75, standoff 0, extent 6.611,9.153 7.36,9.898
3D body: height 0.75, standoff 0, extent 9.151,-9.897 9.9,-9.152
3D body: height 0.75, standoff 0, extent 9.151,-7.357 9.9,-6.612
3D body: height 0.75, standoff 0, extent 9.151,-6.087 9.9,-5.342
3D body: height 0.75, standoff 0, extent 9.151,-4.817 9.9,-4.072
3D body: height 0.75, standoff 0, extent 9.151,-3.547 9.9,-2.802
3D body: height 0.75, standoff 0, extent 9.151,-1.007 9.9,-0.262
3D body: height 0.75, standoff 0, extent 9.151,0.263 9.9,1.008
3D body: height 0.75, standoff 0, extent 9.151,2.803 9.9,3.548
3D body: height 0.75, standoff 0, extent 9.151,4.073 9.9,4.818
3D body: height 0.75, standoff 0, extent 9.151,5.343 9.9,6.088
3D body: height 0.75, standoff 0, extent 9.151,6.613 9.9,7.358
3D body: height 0.75, standoff 0, extent 9.151,9.153 9.9,9.898
3D body: height 0.75, standoff 0, extent -9.899,-8.627 -9.15,-7.882
3D body: height 0.75, standoff 0, extent -9.899,-2.277 -9.15,-1.532
3D body: height 0.75, standoff 0, extent -9.899,1.533 -9.15,2.278
3D body: height 0.75, standoff 0, extent -9.899,7.883 -9.15,8.628
3D body: height 0.75, standoff 0, extent -7.359,-8.627 -6.61,-7.882
3D body: height 0.75, standoff 0, extent -7.359,-2.277 -6.61,-1.532
3D body: height 0.75, standoff 0, extent -7.359,1.533 -6.61,2.278
3D body: height 0.75, standoff 0, extent -7.359,7.883 -6.61,8.628
3D body: height 0.75, standoff 0, extent -6.089,-8.627 -5.34,-7.882
3D body: height 0.75, standoff 0, extent -4.819,-8.627 -4.07,-7.882
3D body: height 0.75, standoff 0, extent -6.089,-2.277 -5.34,-1.532
3D body: height 0.75, standoff 0, extent -4.819,-2.277 -4.07,-1.532
3D body: height 0.75, standoff 0, extent -6.089,1.533 -5.34,2.278
3D body: height 0.75, standoff 0, extent -4.819,1.533 -4.07,2.278
3D body: height 0.75, standoff 0, extent -6.089,7.883 -5.34,8.628
3D body: height 0.75, standoff 0, extent -4.819,7.883 -4.07,8.628
3D body: height 0.75, standoff 0, extent -3.549,-8.627 -2.8,-7.882
3D body: height 0.75, standoff 0, extent -3.549,-2.277 -2.8,-1.532
3D body: height 0.75, standoff 0, extent -3.549,1.533 -2.8,2.278
3D body: height 0.75, standoff 0, extent -3.549,7.883 -2.8,8.628
3D body: height 0.75, standoff 0, extent -1.009,-8.627 -0.26,-7.882
3D body: height 0.75, standoff 0, extent -1.009,-2.277 -0.26,-1.532
3D body: height 0.75, standoff 0, extent -1.009,1.533 -0.26,2.278
3D body: height 0.75, standoff 0, extent -1.009,7.883 -0.26,8.628
3D body: height 0.75, standoff 0, extent 0.261,-8.627 1.01,-7.882
3D body: height 0.75, standoff 0, extent 0.261,-2.277 1.01,-1.532
3D body: height 0.75, standoff 0, extent 0.261,1.533 1.01,2.278
3D body: height 0.75, standoff 0, extent 0.261,7.883 1.01,8.628
3D body: height 0.75, standoff 0, extent 2.801,-8.627 3.55,-7.882
3D body: height 0.75, standoff 0, extent 2.801,-2.277 3.55,-1.532
3D body: height 0.75, standoff 0, extent 2.801,1.533 3.55,2.278
3D body: height 0.75, standoff 0, extent 2.801,7.883 3.55,8.628
3D body: height 0.75, standoff 0, extent 4.071,-8.627 4.82,-7.882
3D body: height 0.75, standoff 0, extent 5.341,-8.627 6.09,-7.882
3D body: height 0.75, standoff 0, extent 4.071,-2.277 4.82,-1.532
3D body: height 0.75, standoff 0, extent 5.341,-2.277 6.09,-1.532
3D body: height 0.75, standoff 0, extent 4.071,1.533 4.82,2.278
3D body: height 0.75, standoff 0, extent 5.341,1.533 6.09,2.278
3D body: height 0.75, standoff 0, extent 4.071,7.883 4.82,8.628
3D body: height 0.75, standoff 0, extent 5.341,7.883 6.09,8.628
3D body: height 0.75, standoff 0, extent 6.611,-8.627 7.36,-7.882
3D body: height 0.75, standoff 0, extent 6.611,-2.277 7.36,-1.532
3D body: height 0.75, standoff 0, extent 6.611,1.533 7.36,2.278
3D body: height 0.75, standoff 0, extent 6.611,7.883 7.36,8.628
3D body: height 0.75, standoff 0, extent 9.151,-8.627 9.9,-7.882
3D body: height 0.75, standoff 0, extent 9.151,-2.277 9.9,-1.532
3D body: height 0.75, standoff 0, extent 9.151,1.533 9.9,2.278
3D body: height 0.75, standoff 0, extent 9.151,7.883 9.9,8.628
3D body: height 0.75, standoff 0, extent -8.629,-9.897 -7.88,-9.152
3D body: height 0.75, standoff 0, extent -2.279,-9.897 -1.53,-9.152
3D body: height 0.75, standoff 0, extent -8.629,-7.357 -7.88,-6.612
3D body: height 0.75, standoff 0, extent -2.279,-7.357 -1.53,-6.612
3D body: height 0.75, standoff 0, extent -8.629,-6.087 -7.88,-5.342
3D body: height 0.75, standoff 0, extent -2.279,-6.087 -1.53,-5.342
3D body: height 0.75, standoff 0, extent -8.629,-4.817 -7.88,-4.072
3D body: height 0.75, standoff 0, extent -2.279,-4.817 -1.53,-4.072
3D body: height 0.75, standoff 0, extent -8.629,-3.547 -7.88,-2.802
3D body: height 0.75, standoff 0, extent -2.279,-3.547 -1.53,-2.802
3D body: height 0.75, standoff 0, extent -8.629,-1.007 -7.88,-0.262
3D body: height 0.75, standoff 0, extent -2.279,-1.007 -1.53,-0.262
3D body: height 0.75, standoff 0, extent -8.629,0.263 -7.88,1.008
3D body: height 0.75, standoff 0, extent -2.279,0.263 -1.53,1.008
3D body: height 0.75, standoff 0, extent -8.629,2.803 -7.88,3.548
3D body: height 0.75, standoff 0, extent -2.279,2.803 -1.53,3.548
3D body: height 0.75, standoff 0, extent -8.629,4.073 -7.88,4.818
3D body: height 0.75, standoff 0, extent -2.279,4.073 -1.53,4.818
3D body: height 0.75, standoff 0, extent -8.629,5.343 -7.88,6.088
3D body: height 0.75, standoff 0, extent -2.279,5.343 -1.53,6.088
3D body: height 0.75, standoff 0, extent -8.629,6.613 -7.88,7.358
3D body: height 0.75, standoff 0, extent -2.279,6.613 -1.53,7.358
3D body: height 0.75, standoff 0, extent -2.279,9.153 -1.53,9.898
3D body: height 0.75, standoff 0, extent -8.629,9.153 -7.88,9.898
3D body: height 0.75, standoff 0, extent 1.531,-9.897 2.28,-9.152
3D body: height 0.75, standoff 0, extent 1.531,-7.357 2.28,-6.612
3D body: height 0.75, standoff 0, extent 1.531,-6.087 2.28,-5.342
3D body: height 0.75, standoff 0, extent 1.531,-4.817 2.28,-4.072
3D body: height 0.75, standoff 0, extent 1.531,-3.547 2.28,-2.802
3D body: height 0.75, standoff 0, extent 1.531,-1.007 2.28,-0.262
3D body: height 0.75, standoff 0, extent 1.531,0.263 2.28,1.008
3D body: height 0.75, standoff 0, extent 1.531,2.803 2.28,3.548
3D body: height 0.75, standoff 0, extent 1.531,4.073 2.28,4.818
3D body: height 0.75, standoff 0, extent 1.531,5.343 2.28,6.088
3D body: height 0.75, standoff 0, extent 1.531,6.613 2.28,7.358
3D body: height 0.75, standoff 0, extent 1.531,9.153 2.28,9.898
3D body: height 0.75, standoff 0, extent 7.881,-9.897 8.63,-9.152
3D body: height 0.75, standoff 0, extent 7.881,-7.357 8.63,-6.612
3D body: height 0.75, standoff 0, extent 7.881,-6.087 8.63,-5.342
3D body: height 0.75, standoff 0, extent 7.881,-4.817 8.63,-4.072
3D body: height 0.75, standoff 0, extent 7.881,-3.547 8.63,-2.802
3D body: height 0.75, standoff 0, extent 7.881,-1.007 8.63,-0.262
3D body: height 0.75, standoff 0, extent 7.881,0.263 8.63,1.008
3D body: height 0.75, standoff 0, extent 7.881,2.803 8.63,3.548
3D body: height 0.75, standoff 0, extent 7.881,4.073 8.63,4.818
3D body: height 0.75, standoff 0, extent 7.881,5.343 8.63,6.088
3D body: height 0.75, standoff 0, extent 7.881,6.613 8.63,7.358
3D body: height 0.75, standoff 0, extent 7.881,9.153 8.63,9.898
3D body: height 0.75, standoff 0, extent -8.629,-8.627 -7.88,-7.882
3D body: height 0.75, standoff 0, extent -2.279,-8.627 -1.53,-7.882
3D body: height 0.75, standoff 0, extent -8.629,-2.277 -7.88,-1.532
3D body: height 0.75, standoff 0, extent -2.279,-2.277 -1.53,-1.532
3D body: height 0.75, standoff 0, extent -8.629,1.533 -7.88,2.278
3D body: height 0.75, standoff 0, extent -2.279,1.533 -1.53,2.278
3D body: height 0.75, standoff 0, extent -8.629,7.883 -7.88,8.628
3D body: height 0.75, standoff 0, extent -2.279,7.883 -1.53,8.628
3D body: height 0.75, standoff 0, extent 1.531,-8.627 2.28,-7.882
3D body: height 0.75, standoff 0, extent 1.531,-2.277 2.28,-1.532
3D body: height 0.75, standoff 0, extent 1.531,1.533 2.28,2.278
3D body: height 0.75, standoff 0, extent 1.531,7.883 2.28,8.628
3D body: height 0.75, standoff 0, extent 7.881,-8.627 8.63,-7.882
3D body: height 0.75, standoff 0, extent 7.881,-2.277 8.63,-1.532
3D body: height 0.75, standoff 0, extent 7.881,1.533 8.63,2.278
3D body: height 0.75, standoff 0, extent 7.881,7.883 8.63,8.628
3D body: height 3.08, standoff 0.6, extent -10.6,-10.6 10.6,10.6